# Altium footprint library Hare_Library.PcbLib: 252 footprints (part 12 of 16)
Each footprint in its own frame and in the unit in brackets; x right, y up, seen from the top. Pads: shape width x height; smd on the part's side, far side on the other; paste and mask are expansions set on the pad; w line width, h text height; cw(c..) or ccw(c..) is an arc to the next point about the centre after c.
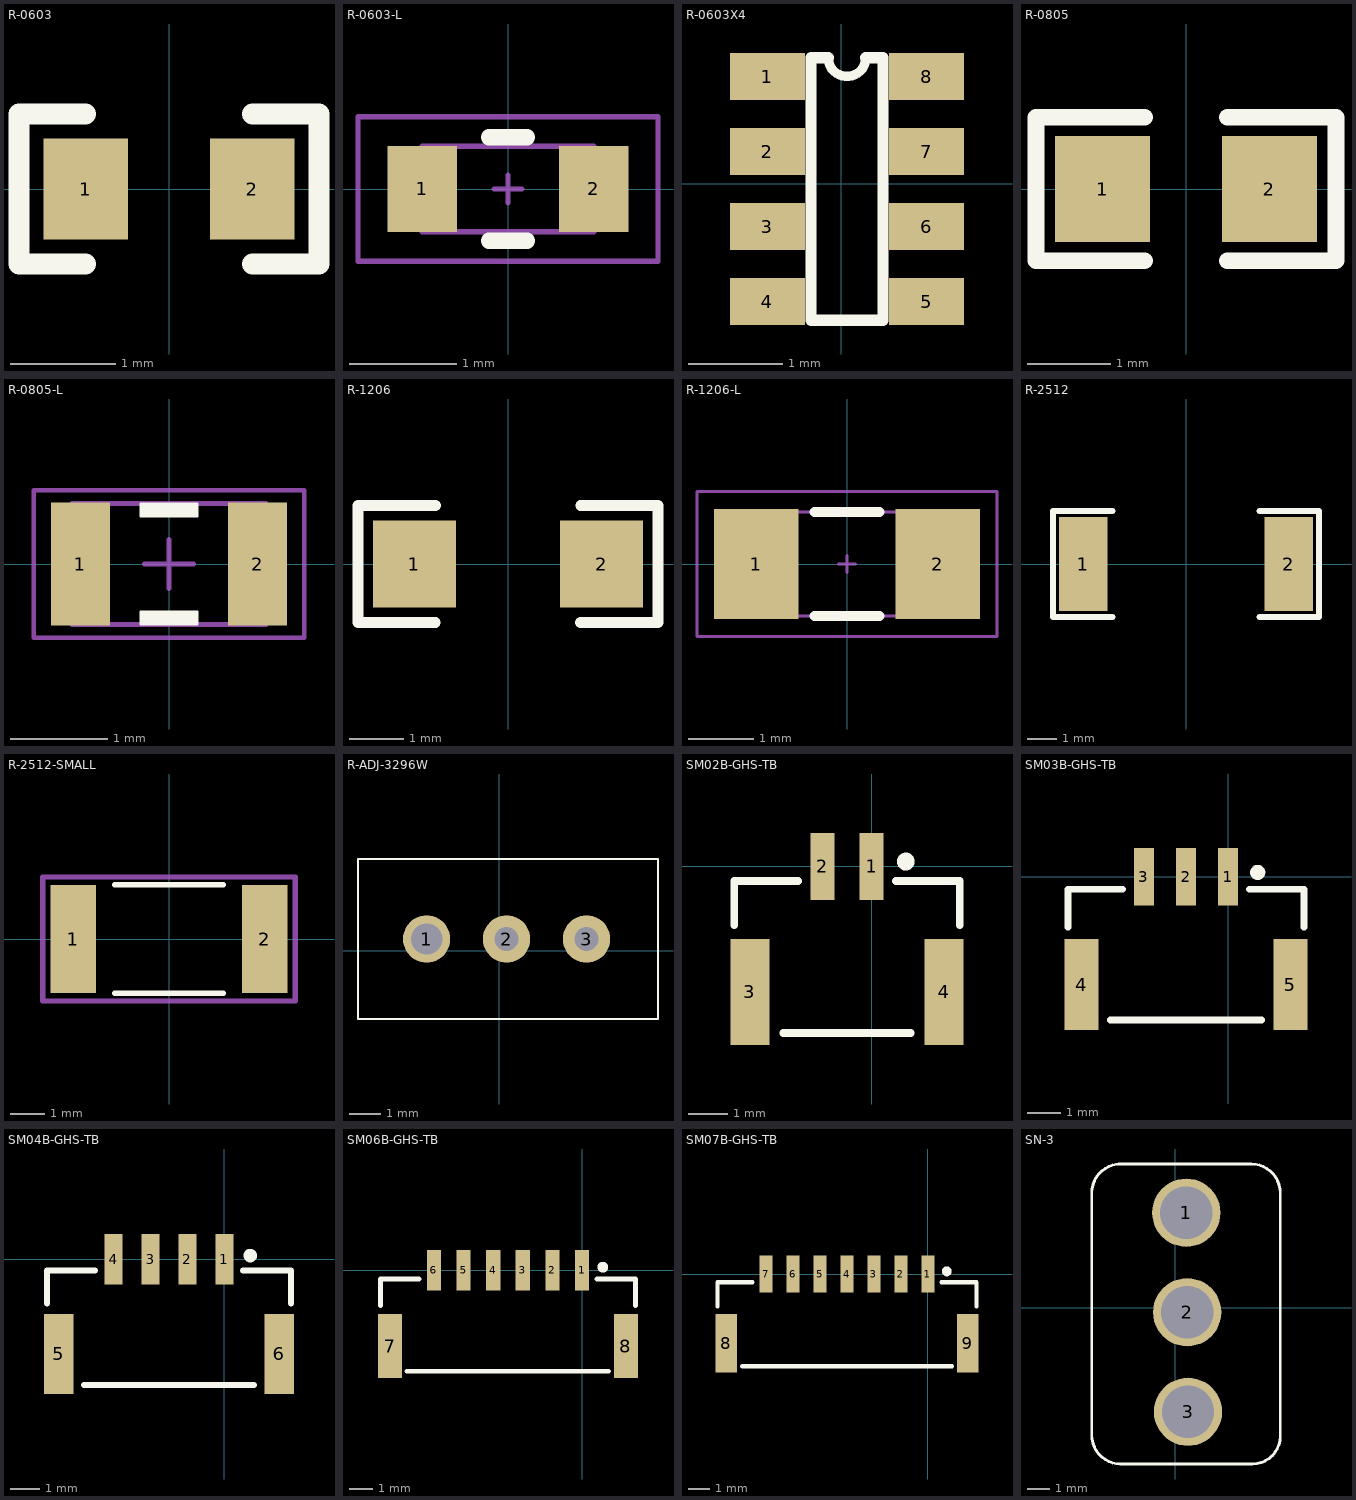
[diagram p11: the footprints below, top view; thin cyan lines are the x and y axes]

## R-0603 [mm]
pads (2):
  rect 0.8x0.96 smd: 1(-0.79,0) 2(0.79,0)
Top Overlay:
  lines w0.2: -0.79,-0.711 -1.422,-0.711 -1.422,0.711 -0.79,0.711 ; 0.79,-0.711 1.422,-0.711 1.422,0.711 0.79,0.711
3D body "R_0603.STEP": height 0.41, standoff -0.01, extent -0.762,-0.381 0.762,0.381

## R-0603-L [mm]
height 0.35
pads (2):
  rect 0.65x0.8 smd: 1(-0.8,0) 2(0.8,0)
Top Overlay:
  lines w0.152: -0.178,-0.483 0.178,-0.483 ; -0.178,0.483 0.178,0.483
Mechanical 13:
  lines w0.051: -0.127,0 0.127,0 ; 0,-0.127 0,0.127 ; -0.8,-0.4 -0.8,0.4 0.8,0.4 0.8,-0.4 -0.8,-0.4
Mechanical 14:
  lines w0.051: -1.4,-0.675 -1.4,0.675 1.4,0.675 1.4,-0.675 -1.4,-0.675
3D body "RESC1608X05L.step": height 0.45, standoff 0, extent -0.8,-0.4 0.8,0.4

## R-0603X4 [mm]
pads (8):
  rect 0.8x0.5 smd: 1(-0.787,1.143) 2(-0.787,0.343) 3(-0.787,-0.457) 4(-0.787,-1.257) 5(0.913,-1.257) 6(0.913,-0.457) 7(0.913,0.343) 8(0.913,1.143)
Top Overlay:
  lines w0.1: -0.137,1.343 ccw(c0.063,1.343) 0.263,1.343
  lines w0.12: -0.137,1.343 -0.322,1.343 -0.322,-1.457 0.448,-1.457 0.448,1.343 0.263,1.343
3D body "User Library-R-0603-Array-4-1.SLDPRT": height 0.51, standoff -0.01, extent -0.724,-1.651 0.876,1.549

## R-0805 [mm]
pads (2):
  rect 1.14x1.27 smd: 1(-1.003,0) 2(1.003,0)
Top Overlay:
  lines w0.2: -0.495,-0.864 -1.803,-0.864 -1.803,0.864 -0.495,0.864 ; 0.495,-0.864 1.803,-0.864 1.803,0.864 0.495,0.864
3D body "R_0805.STEP": height 0.51, standoff -0.01, extent -1.016,-0.635 1.016,0.635

## R-0805-L [mil]
pads (2):
  rect 24x50 smd: 1(-36,0) 2(36,0)
Top Overlay:
  region: -11.5,24.5 11.5,24.5 11.5,19.5 -11.5,19.5
  region: 11.5,-24.5 -11.5,-24.5 -11.5,-19.5 11.5,-19.5
  lines w1: -11.5,-24.5 -11.5,-19.5 11.5,-19.5 11.5,-24.5 -11.5,-24.5 ; -11.5,19.5 11.5,19.5 11.5,24.5 -11.5,24.5 -11.5,19.5
Mechanical 13:
  lines w2: -10,0 10,0 ; 0,-10 0,10 ; -39.37,-24.61 -39.37,24.61 39.37,24.61 39.37,-24.61 -39.37,-24.61
Mechanical 14:
  lines w2: -55,-30 55,-30 55,30 -55,30 -55,-30
3D body "RESC2012X06L.step": height 23.62, standoff 0, extent -39.37,-24.6 39.37,24.61

## R-1206 [mm]
pads (2):
  rect 1.52x1.6 smd: 1(-1.713,0) 2(1.712,0)
Top Overlay:
  lines w0.2: -1.331,-1.067 -2.743,-1.067 -2.743,1.067 -1.323,1.067 ; 1.322,-1.067 2.743,-1.067 2.743,1.067 1.331,1.067
3D body "R_1206.STEP": height 1.01, standoff -0.01, extent -1.6,-0.8 1.6,0.8

## R-1206-L [mm] "Chip Res, 2-Leads, Body 3.20x1.60mm, IPC Medium Density"
height 1.23
pads (2):
  rect 1.3x1.7 smd: 1(-1.4,0) 2(1.4,0)
Top Overlay:
  lines w0.152: -0.5,-0.8 0.5,-0.8 ; -0.5,0.8 0.5,0.8
Mechanical 13:
  lines w0.051: -0.127,0 0.127,0 ; 0,-0.127 0,0.127 ; -1.6,-0.8 1.6,-0.8 1.6,0.8 -1.6,0.8 -1.6,-0.8
Mechanical 14:
  lines w0.051: -2.311,-1.118 2.311,-1.118 2.311,1.118 -2.311,1.118 -2.311,-1.118
3D body "R_1206.STEP": height 1.01, standoff -0.01, extent -1.6,-0.8 1.6,0.8

## R-2512 [mm]
pads (2):
  rect 1.65x3.2 smd: 1(-3.494,0) 2(3.494,0)
Top Overlay:
  lines w0.2: -2.494,-1.803 -4.521,-1.803 -4.521,1.803 -2.494,1.803 ; 2.494,-1.803 4.521,-1.803 4.521,1.803 2.494,1.803
3D body "R_2512.STEP": height 0.66, standoff -0.01, extent -3.175,-1.6 3.175,1.6

## R-2512-SMALL [mm]
pads (2):
  rect 1.35x3.2 smd: 1(-2.825,0) 2(2.825,0)
Top Overlay:
  lines w0.15: -1.6,-1.6 1.6,-1.6 ; -1.6,1.6 1.6,1.6
Mechanical 14:
  lines w0.15: -3.725,-1.825 -3.725,1.825 3.725,1.825 3.725,-1.825 -3.725,-1.825
3D body "R_2512.STEP": height 0.66, standoff -0.01, extent -3.175,-1.6 3.175,1.6

## R-ADJ-3296W [mm]
pads (3):
  round 1.5 hole 1: 1(-2.306,0.378)
  round 1.5 hole 0.762: 2(0.234,0.378) 3(2.774,0.378)
Top Overlay:
  lines w0.051: -4.445,-2.162 -0.346,-2.162 -4.486,-2.162 -4.486,2.918 -0.346,2.918 ; -1.766,-2.162 4.734,-2.162 ; -1.087,2.918 5.044,2.918 5.044,-2.162 0.774,-2.162 5.029,-2.162 ; -4.306,-2.162 2.194,-2.162 -4.306,-2.162
3D body "User Library-3296W.SLDPRT": height 11.55, standoff -1.6, extent -4.486,-2.032 5.044,2.768

## SM02B-GHS-TB [mm] "GH02卧式"
height 4.25
pads (4):
  rect 0.6x1.7 smd: 1(0,0) 2(-1.25,0)
  rect 1x2.7 smd: 3(-3.1,-3.2) 4(1.85,-3.2)
Top Overlay:
  circle w0.254: c0.875,0.125 r0.1
  lines w0.2: -3.5,-1.5 -3.5,-0.375 -1.875,-0.375 ; -2.25,-4.25 1,-4.25 ; 0.625,-0.375 2.25,-0.375 2.25,-1.5
3D body "SM02B-GHS-TB.STEP": height 4.35, standoff 0, extent -3.5,-4.3 2.25,0.55

## SM03B-GHS-TB [mm] "GH03卧式"
height 4.25
pads (5):
  rect 0.6x1.7 smd: 1(0,0) 2(-1.25,0) 3(-2.5,0)
  rect 1x2.7 smd: 4(-4.35,-3.2) 5(1.85,-3.2)
Top Overlay:
  circle w0.254: c0.875,0.125 r0.1
  lines w0.2: -4.75,-1.5 -4.75,-0.375 -3.125,-0.375 ; -3.5,-4.25 1,-4.25 ; 0.625,-0.375 2.25,-0.375 2.25,-1.5
3D body "SM03B-GHS-TB.STEP": height 4.35, standoff 0, extent -4.75,-4.3 2.25,0.55

## SM04B-GHS-TB [mm] "GH04卧式"
height 4.25
pads (6):
  rect 0.6x1.7 smd: 1(0,0) 2(-1.25,0) 3(-2.5,0) 4(-3.75,0)
  rect 1x2.7 smd: 5(-5.6,-3.2) 6(1.85,-3.2)
Top Overlay:
  circle w0.254: c0.875,0.125 r0.1
  lines w0.2: -6,-1.5 -6,-0.375 -4.375,-0.375 ; -4.75,-4.25 1,-4.25 ; 0.625,-0.375 2.25,-0.375 2.25,-1.5
3D body "SM04B-GHS-TB.STEP": height 4.35, standoff 0, extent -6,-4.3 2.25,0.55

## SM06B-GHS-TB [mm] "GH06卧式"
height 4.25
pads (8):
  rect 0.6x1.7 smd: 1(0,0) 2(-1.25,0) 3(-2.5,0) 4(-3.75,0) 5(-5,0) 6(-6.25,0)
  rect 1x2.7 smd: 7(-8.1,-3.2) 8(1.85,-3.2)
Top Overlay:
  circle w0.254: c0.875,0.125 r0.1
  lines w0.2: -8.5,-1.5 -8.5,-0.375 -6.875,-0.375 ; -7.391,-4.267 1.118,-4.267 ; 0.625,-0.375 2.25,-0.375 2.25,-1.5
3D body "SM06B-GHS-TB.STEP": height 4.35, standoff 0, extent -8.5,-4.3 2.25,0.55

## SM07B-GHS-TB [mm] "GH07卧式"
height 4.25
pads (9):
  rect 0.6x1.7 smd: 1(0,0) 2(-1.25,0) 3(-2.5,0) 4(-3.75,0) 5(-5,0) 6(-6.25,0) 7(-7.5,0)
  rect 1x2.7 smd: 8(-9.35,-3.2) 9(1.85,-3.2)
Top Overlay:
  circle w0.254: c0.875,0.125 r0.1
  lines w0.2: -9.75,-1.5 -9.75,-0.375 -8.125,-0.375 ; -8.611,-4.267 1.118,-4.267 ; 0.625,-0.375 2.25,-0.375 2.25,-1.5
3D body "SM07B-GHS-TB.STEP": height 4.35, standoff 0, extent -9.75,-4.3 2.25,0.55

## SN-3 [mm]
pads (3):
  round 3 hole 2.3: 1(0.483,4.171) 2(0.521,-0.203) 3(0.558,-4.578)
Top Overlay:
  lines w0.127: -2.502,6.311 0.419,6.311 3.34,6.311 cw(c3.34,5.041) 4.61,5.041 4.61,-5.652 cw(c3.391,-5.652) 3.391,-6.871 ; -2.421,-6.867 3.391,-6.871 ; -2.4,-6.871 cw(c-2.4,-5.601) -3.67,-5.601 -3.67,5.041 cw(c-2.4,5.041) -2.4,6.311 ; 1.511,-6.871 3.391,-6.871
3D body "User Library-7101SYZBE CK switch.SLDPRT": height 29.71, standoff -2.67, extent -2.923,-6.586 3.937,6.129